# Altium footprint library StandardCase.PcbLib: 205 footprints (part 9 of 13)
Each footprint in its own frame and in the unit in brackets; x right, y up, seen from the top. Pads: shape width x height; smd on the part's side, far side on the other; paste and mask are expansions set on the pad; w line width, h text height; cw(c..) or ccw(c..) is an arc to the next point about the centre after c.
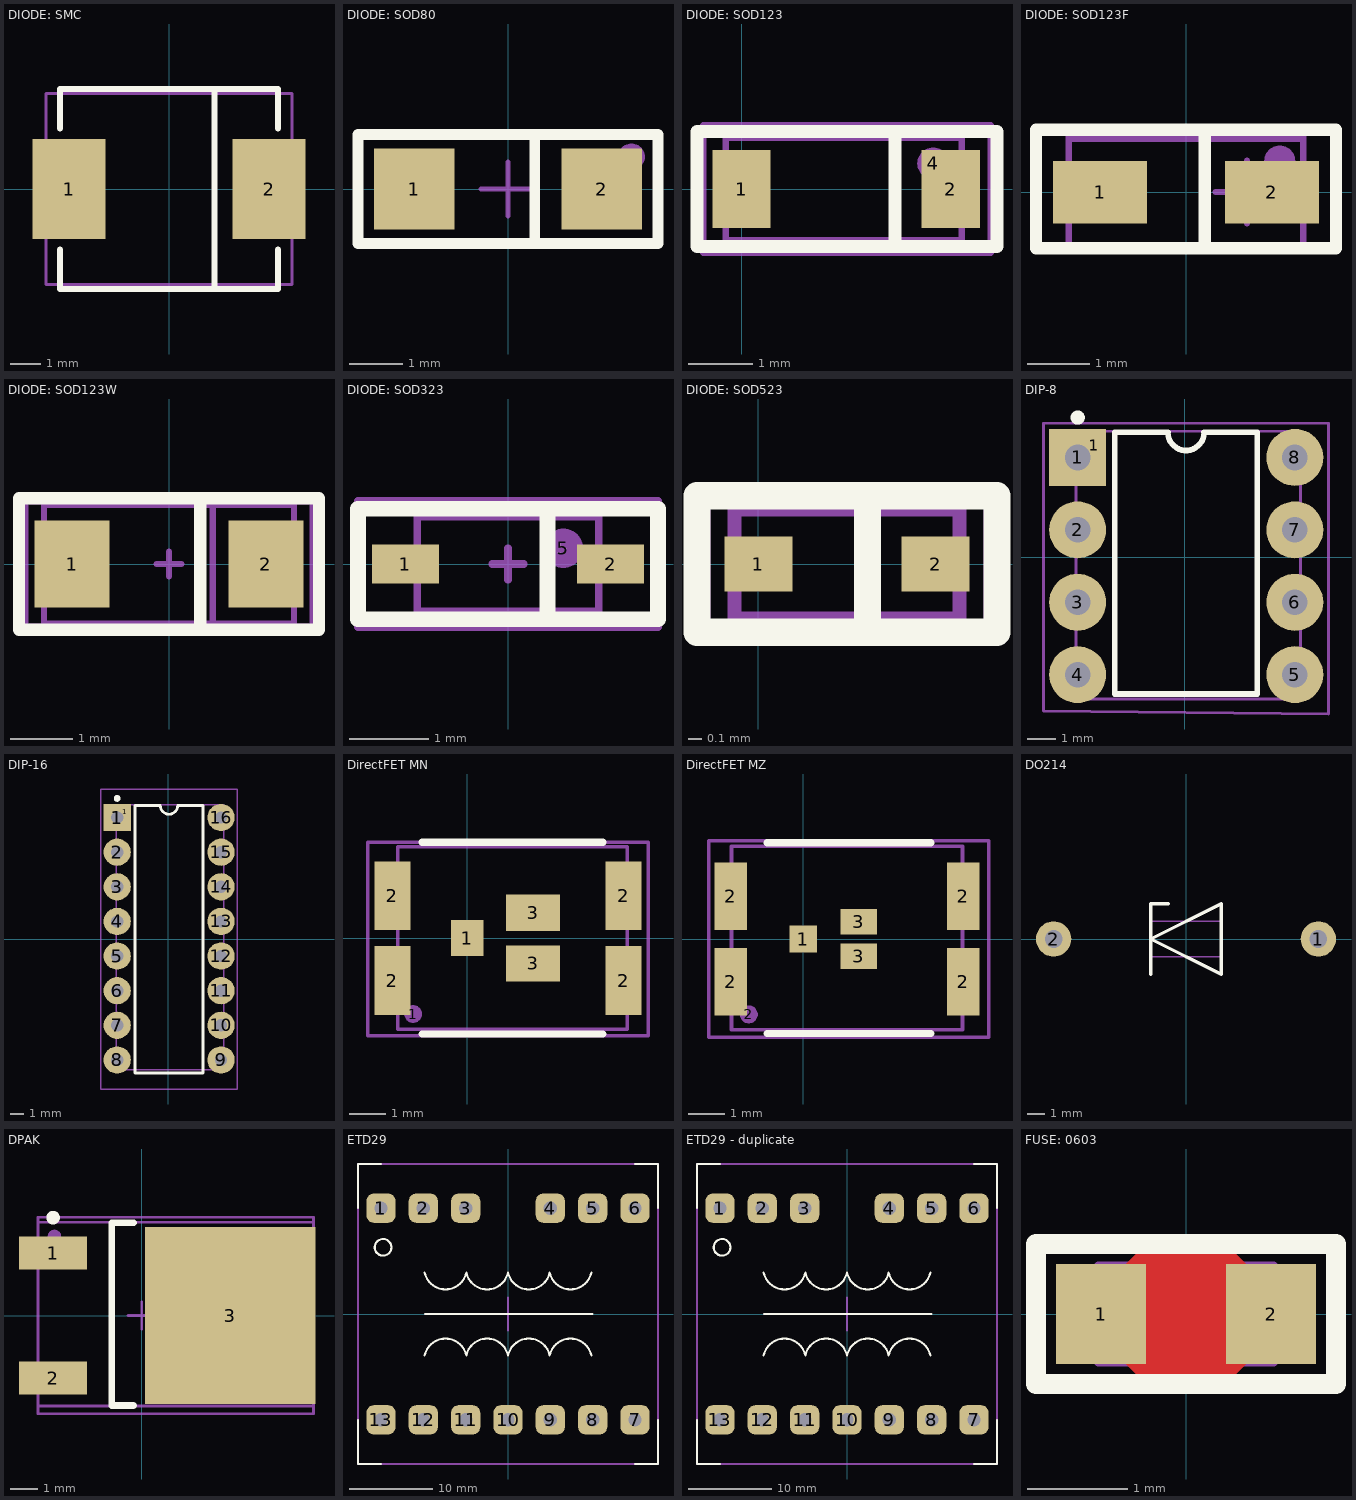
[diagram p8: the footprints below, top view; thin cyan lines are the x and y axes]

## DIODE: SMC [mm]
pads (2):
  rect 2.4x3.3 smd: 1(-3.3,0) 2(3.3,0)
Top Overlay:
  lines w0.2: -3.6,-2 -3.6,-3.3 3.6,-3.3 3.6,-2 ; -3.6,2 -3.6,3.3 3.6,3.3 3.6,2 ; 1.5,-3.3 1.5,3.3
Mechanical 1:
  lines w0.1: 1.5,-3.15 1.5,3.15 ; -4.064,-3.15 -4.064,3.15 4.064,3.15 4.064,-3.15 -4.064,-3.15
3D body "User Library-DO-214AB(SMC).STEP": height 2.67, standoff 0.03, extent -4.064,-3.15 4.064,3.15

## DIODE: SOD80 [mm]
height 2
pads (3):
  rect 1.5x1.5 smd: 1(-1.75,0) 2(1.75,0)
  round 0.5 on Mech1: ""(2.3,0.6)
Top Overlay:
  lines w0.2: 0.5,-1.016 0.5,1 ; -2.794,-1.016 2.794,-1.016 2.794,1.016 -2.794,1.016 -2.794,-1.016
Mechanical 1:
  lines w0.1: 0.5,-1.016 0.5,1.016 ; -2.794,-1.016 2.794,-1.016 2.794,1.016 -2.794,1.016 -2.794,-1.016
Mechanical 15:
  lines w0.1: -0.5,0 0.5,0 ; 0,-0.5 0,0.5 ; -2.794,-1.016 -2.794,1.016 2.794,1.016 2.794,-1.016 -2.794,-1.016
3D body "SOD80-2.step": height 1.52, standoff -0.02, extent -1.676,-0.777 1.677,0.762

## DIODE: SOD123 [mm]
pads (3):
  rect 0.91x1.22 smd: 1(0,0) 2(3.275,0)
  round 0.5 on Mech1: 4(3,0.4)
Top Overlay:
  lines w0.2: 2.4,-0.9 2.4,0.9 ; -0.7,-0.9 -0.7,0.9 4,0.9 4,-0.9 -0.7,-0.9
Mechanical 1:
  lines w0.1: -0.249,-0.8 -0.249,0.8 3.449,0.8 3.449,-0.8 -0.249,-0.8
Mechanical 15:
  lines w0.1: -0.6,-1 -0.6,1 3.9,1 3.9,-1 -0.6,-1
3D body "User Library-SOD-123.STEP": height 1.25, standoff 0, extent -0.249,-0.8 3.449,0.8

## DIODE: SOD123F [mm]
height 1
pads (3):
  rect 1.5x1 smd: 1(-1.375,0) 2(1.375,0)
  round 0.5 on Mech1: ""(1.5,0.5)
Top Overlay:
  lines w0.2: 0.3,-0.9 0.3,1 ; -2.4,-0.9 2.4,-0.9 2.4,1 2.3,1 -2.4,1 -2.4,-0.9
Mechanical 1:
  lines w0.1: -1.875,-0.85 -1.875,0.85 1.875,0.85 1.875,-0.85 -1.875,-0.85
Mechanical 15:
  lines w0.1: 0.475,0 1.475,0 ; 0.975,-0.5 0.975,0.5 ; -1.875,-0.9 -1.875,0.9 1.875,0.9 1.875,-0.9 -1.875,-0.9
3D body "SOD123F.STEP": height 1.23, standoff 0.02, extent -1.875,-0.85 1.875,0.85

## DIODE: SOD123W [mm]
pads (2):
  rect 1.2x1.4 smd: 1(-1.55,0) 2(1.55,0)
Top Overlay:
  lines w0.2: 0.5,-1.05 0.5,1.05 ; -2.4,-1.05 -2.4,1.05 2.4,1.05 2.4,-1.05 -2.4,-1.05
Mechanical 1:
  lines w0.1: 0.7,-0.95 0.7,0.95 ; 2,-0.95 2,0.95 ; 2,-0.95 2,-0.95 ; 2,-0.95 -2,-0.95 -2,0.95 2,0.95 ; 2,0.95 2,0.95
Mechanical 15:
  lines w0.1: -0.2,0 0.2,0 ; 0,-0.2 0,0.2 ; -2.3,-1 2.3,-1 2.3,1 -2.3,1 -2.3,-1
3D body "User Library-SOD123W.STEP": height 1.1, standoff -0.01, extent -2,-0.95 2,0.95

## DIODE: SOD323 [mm]
pads (3):
  rect 0.85x0.5 smd: 1(-1.3,0) 2(1.3,0)
  round 0.5 on Mech1: 5(0.7,0.2)
Top Overlay:
  lines w0.2: 0.5,-0.7 0.5,0.7 ; -1.9,-0.7 -1.9,0.7 1.9,0.7 1.9,-0.7 -1.9,-0.7
Mechanical 1:
  lines w0.1: -1.15,-0.6 1.15,-0.6 1.15,0.6 -1.15,0.6 -1.15,-0.6
Mechanical 15:
  lines w0.1: -0.2,0 0.2,0 ; 0,-0.2 0,0.2 ; -1.9,-0.8 -1.9,0.8 1.9,0.8 1.9,-0.8 -1.9,-0.8
3D body "User Library-1N4148WS.STEP": height 1.04, standoff -0.06, extent -1.15,-0.6 1.15,0.6

## DIODE: SOD523 [mm]
pads (2):
  rect 0.5x0.4 smd: 1(0,0) 2(1.3,0)
Top Overlay:
  lines w0.2: 0.8,-0.4 0.8,0.5 ; -0.45,-0.5 1.75,-0.5 1.75,0.5 -0.45,0.5 -0.45,-0.5
Mechanical 1:
  lines w0.1: 0.8,-0.4 0.8,0.4 ; -0.175,-0.4 -0.175,0.4 1.4,0.4 1.475,0.4 1.475,-0.4 -0.175,-0.4
Mechanical 15:
  lines w0.1: -0.4,-0.5 1.7,-0.5 1.7,0.5 -0.4,0.5 -0.4,-0.5
3D body "User Library-SOD523-2.STEP": height 0.65, standoff 0, extent -0.175,-0.4 1.475,0.4

## DIP-8 [mm]
pads (9):
  rect 2x2 hole 0.9: 1(-3.75,3.5)
  round 0.7 on Mech1: 1(-3.17,3.92)
  round 2 hole 0.9: 2(-3.75,0.96) 3(-3.75,-1.58) 4(-3.75,-4.12) 5(3.87,-4.12) 6(3.87,-1.58) 7(3.87,0.96) 8(3.87,3.5)
Top Overlay:
  circle w0.25: c-3.75,4.9 r0.125
  lines w0.2: -2.45,-4.8 -2.45,4.38 -0.585,4.38 ccw(c0.05,4.38) 0.685,4.38 2.55,4.38 2.55,-4.8 -2.45,-4.8
Mechanical 1:
  lines w0.1: -3.805,-4.98 -3.805,4.42 4.065,4.42 4.065,-4.98 -3.805,-4.98
Mechanical 15:
  lines w0.1: -4.95,-5.4 5.05,-5.5 5.05,-3.1 5.05,4.7 -4.95,4.7 -4.95,3 -4.95,-5.4
3D body "DIP-7 (VIPER28).stp": height 4.36, standoff -3, extent -3.785,-5 4.085,4.4

## DIP-16 [mm]
pads (17):
  rect 2x2 hole 0.9: 1(-3.75,8.91)
  round 0.7 on Mech1: 1(-3.17,9.33)
  round 2 hole 0.9: 2(-3.75,6.37) 3(-3.75,3.83) 4(-3.75,1.29) 5(-3.75,-1.25) 6(-3.75,-3.79) 7(-3.75,-6.33) 8(-3.75,-8.87) 9(3.87,-8.87) 10(3.87,-6.33) 11(3.87,-3.79) 12(3.87,-1.25) 13(3.87,1.29) 14(3.87,3.83) 15(3.87,6.37) 16(3.87,8.91)
Top Overlay:
  circle w0.25: c-3.75,10.31 r0.125
  lines w0.2: -2.45,-9.83 2.55,-9.83 2.55,9.79 0.685,9.79 cw(c0.05,9.79) -0.585,9.79 -2.45,9.79 -2.45,-9.83
Mechanical 1:
  lines w0.1: -3.805,-9.59 4.065,-9.59 4.065,9.83 -3.805,9.83 -3.805,-9.59
Mechanical 15:
  lines w0.1: -4.95,-11 5.05,-11 5.05,2.31 5.05,11 -4.95,11 -4.95,8.41 -4.95,-11
3D body "CircuitWorks-DIP16.STEP": height 4.19, standoff -2.57, extent -4.004,-10.795 3.87,10.795

## DirectFET MN [mm]
pads (8):
  round 0.5 on Mech1: 1(-1.5,-2.1)
  rect 0.9x1 smd: 1(0,0)
  rect 1x1.9 smd: 2(-2.075,-1.175) 2(-2.075,1.175) 2(4.325,-1.175) 2(4.325,1.175)
  rect 1.5x1 smd: 3(1.82,-0.7) 3(1.82,0.7)
Top Overlay:
  lines w0.2: -1.25,-2.65 3.75,-2.65 ; -1.25,2.65 3.75,2.65
Mechanical 1:
  lines w0.1: -1.925,-2.525 4.425,-2.525 4.425,2.525 -1.925,2.525 -1.925,-2.525
Mechanical 15:
  lines w0.1: -2.75,-2.7 5,-2.7 5,-1.5 5,2.65 -2.75,2.65 -2.75,-2.7
3D body "User Library-DirectFET_MX.STEP": height 0.75, standoff 0, extent -1.925,-2.525 4.425,2.525

## DirectFET MZ [mm]
pads (8):
  rect 0.75x0.75 smd: 1(0,0)
  rrect0% 0.9x1.85 smd: 2(-2,-1.175) 2(-2,1.175) 2(4.4,-1.175) 2(4.4,1.175)
  round 0.5 on Mech1: 2(-1.5,-2.075)
  rect 1x0.7 smd: 3(1.525,-0.475) 3(1.525,0.475)
Top Overlay:
  lines w0.2: -1,-2.6 3.5,-2.6 ; -1,2.65 3.5,2.65
Mechanical 1:
  lines w0.1: -1.975,-2.5 -1.975,2.55 4.375,2.55 4.375,-2.5 -1.975,-2.5
Mechanical 15:
  lines w0.1: -2.6,-2.7 5,-2.7 5.1,-2.7 5.1,2.7 -2.6,2.7 -2.6,-2.7
3D body "User Library-DirectFET_MX.STEP": height 0.75, standoff 0, extent -1.975,-2.5 4.375,2.55

## DO214 [mm]
pads (2):
  round 2 hole 1: 1(7.5,0) 2(-7.5,0)
Top Overlay:
  lines w0.2: -2,-2 -2,2 -1,2 ; -2,0 2,-2 2,2 -2,0
Mechanical 15:
  lines w0.1: -2,-1 2,-1 2,1 -2,1 -2,-1

## DPAK [mm]
height 2.4
pads (4):
  rect 2.5x1.2 smd: 1(-3.25,2.29) 2(-3.25,-2.29)
  rect 6.25x6.5 smd: 3(3.25,0)
  round 0.5 on Mech1: ""(-3.2,2.9)
Top Overlay:
  circle w0.25: c-3.25,3.59 r0.125
  lines w0.25: -0.3,-3.3 -1.1,-3.3 -1.1,3.4 -0.3,3.4
Mechanical 1:
  lines w0.1: -3.798,-3.317 -3.798,3.417 6.302,3.417 ; -3.798,-3.317 -3.798,-3.317 ; -3.798,-3.317 6.302,-3.317 6.302,3.417 ; 6.302,3.417 6.302,3.417
Mechanical 15:
  lines w0.1: -0.5,0 0.5,0 ; 0,-0.5 0,0.5 ; -3.8,-3.6 6.3,-3.6 6.3,3.6 -3.8,3.6 -3.8,-3.6
3D body "User Library-DPAK_TO-252AA.STEP": height 2.37, standoff -0.03, extent -3.798,-3.317 6.302,3.417

## ETD29 [mm]
pads (13):
  rrect50% 3.5x3.5 hole 1.6: 1(-15.24,12.7) 2(-10.16,12.7) 3(-5.08,12.7) 4(5.08,12.7) 5(10.16,12.7) 6(15.24,12.7) 7(15.24,-12.7) 8(10.16,-12.7) 9(5.08,-12.7) 10(0,-12.7) 11(-5.08,-12.7) 12(-10.16,-12.7) 13(-15.24,-12.7)
Top Overlay:
  circle w0.254: c-15,8 r1
  lines w0.2: -18,-12.7 -18,-18 -15.24,-18 ; -18,12.7 -18,18 -15.24,18 ; -10,0 10.16,0 ; 15.24,-18 18,-18 18,-12.7 ; 15.24,18 18,18 18,12.7
  lines w0.254: -10,-5 cw(c-7.5,-5.5) -5,-5 cw(c-2.5,-5.5) 0,-5 cw(c2.5,-5.5) 5,-5 cw(c7.5,-5.5) 10,-5 ; -10,5 ccw(c-7.5,5.5) -5,5 ccw(c-2.5,5.5) 0,5 ccw(c2.5,5.5) 5,5 ccw(c7.5,5.5) 10,5
Mechanical 15:
  lines w0.2: -2,0 2,0 ; 0,-2 0,2 ; -18,-18 18,-18 18,18 -18,18 -18,-18
3D body "User Library-ETD29.STEP": height 22.61, standoff -5.5, extent -17.7,-17.5 17.5,17.5

## ETD29 - duplicate [mm]
pads (13):
  rrect50% 3.5x3.5 hole 1.6: 1(-15.24,12.7) 2(-10.16,12.7) 3(-5.08,12.7) 4(5.08,12.7) 5(10.16,12.7) 6(15.24,12.7) 7(15.24,-12.7) 8(10.16,-12.7) 9(5.08,-12.7) 10(0,-12.7) 11(-5.08,-12.7) 12(-10.16,-12.7) 13(-15.24,-12.7)
Top Overlay:
  circle w0.254: c-15,8 r1
  lines w0.2: -18,-12.7 -18,-18 -15.24,-18 ; -18,12.7 -18,18 -15.24,18 ; -10,0 10.16,0 ; 15.24,-18 18,-18 18,-12.7 ; 15.24,18 18,18 18,12.7
  lines w0.254: -10,-5 cw(c-7.5,-5.5) -5,-5 cw(c-2.5,-5.5) 0,-5 cw(c2.5,-5.5) 5,-5 cw(c7.5,-5.5) 10,-5 ; -10,5 ccw(c-7.5,5.5) -5,5 ccw(c-2.5,5.5) 0,5 ccw(c2.5,5.5) 5,5 ccw(c7.5,5.5) 10,5
Mechanical 15:
  lines w0.2: -2,0 2,0 ; 0,-2 0,2 ; -18,-18 -18,18 18,18 18,-18 -18,-18

## FUSE: 0603 [mm]
height 0.55
pads (2):
  rect 0.9x1 smd: 1(-0.85,0) 2(0.85,0)
Top Layer:
  pour cut-out: -0.6,0.5 -0.4,0.7 0.4,0.7 0.6,0.5 0.6,-0.5 0.4,-0.7 -0.4,-0.7 -0.6,-0.5
Top Overlay:
  lines w0.2: -1.5,-0.7 -1.5,0.7 1.5,0.7 1.5,-0.7 -1.5,-0.7
Mechanical 1:
  lines w0.1: -0.875,-0.475 -0.875,0.475 0.875,0.475 0.875,-0.475 -0.875,-0.475
Mechanical 15:
  lines w0.1: -0.2,0 0.2,0 ; 0,-0.2 0,0.2 ; -1.5,-0.7 -1.5,0.7 1.5,0.7 1.5,-0.7 -1.4,-0.7 -1.5,-0.7
3D body "RES 0603 (1608 metric).STEP": height 0.54, standoff -0.01, extent -0.875,-0.475 0.875,0.475